# Altium footprint library ZLS_Lib.PcbLib: 157 footprints (part 1 of 10)
Each footprint in its own frame and in the unit in brackets; x right, y up, seen from the top. Pads: shape width x height; smd on the part's side, far side on the other; paste and mask are expansions set on the pad; w line width, h text height; cw(c..) or ccw(c..) is an arc to the next point about the centre after c.
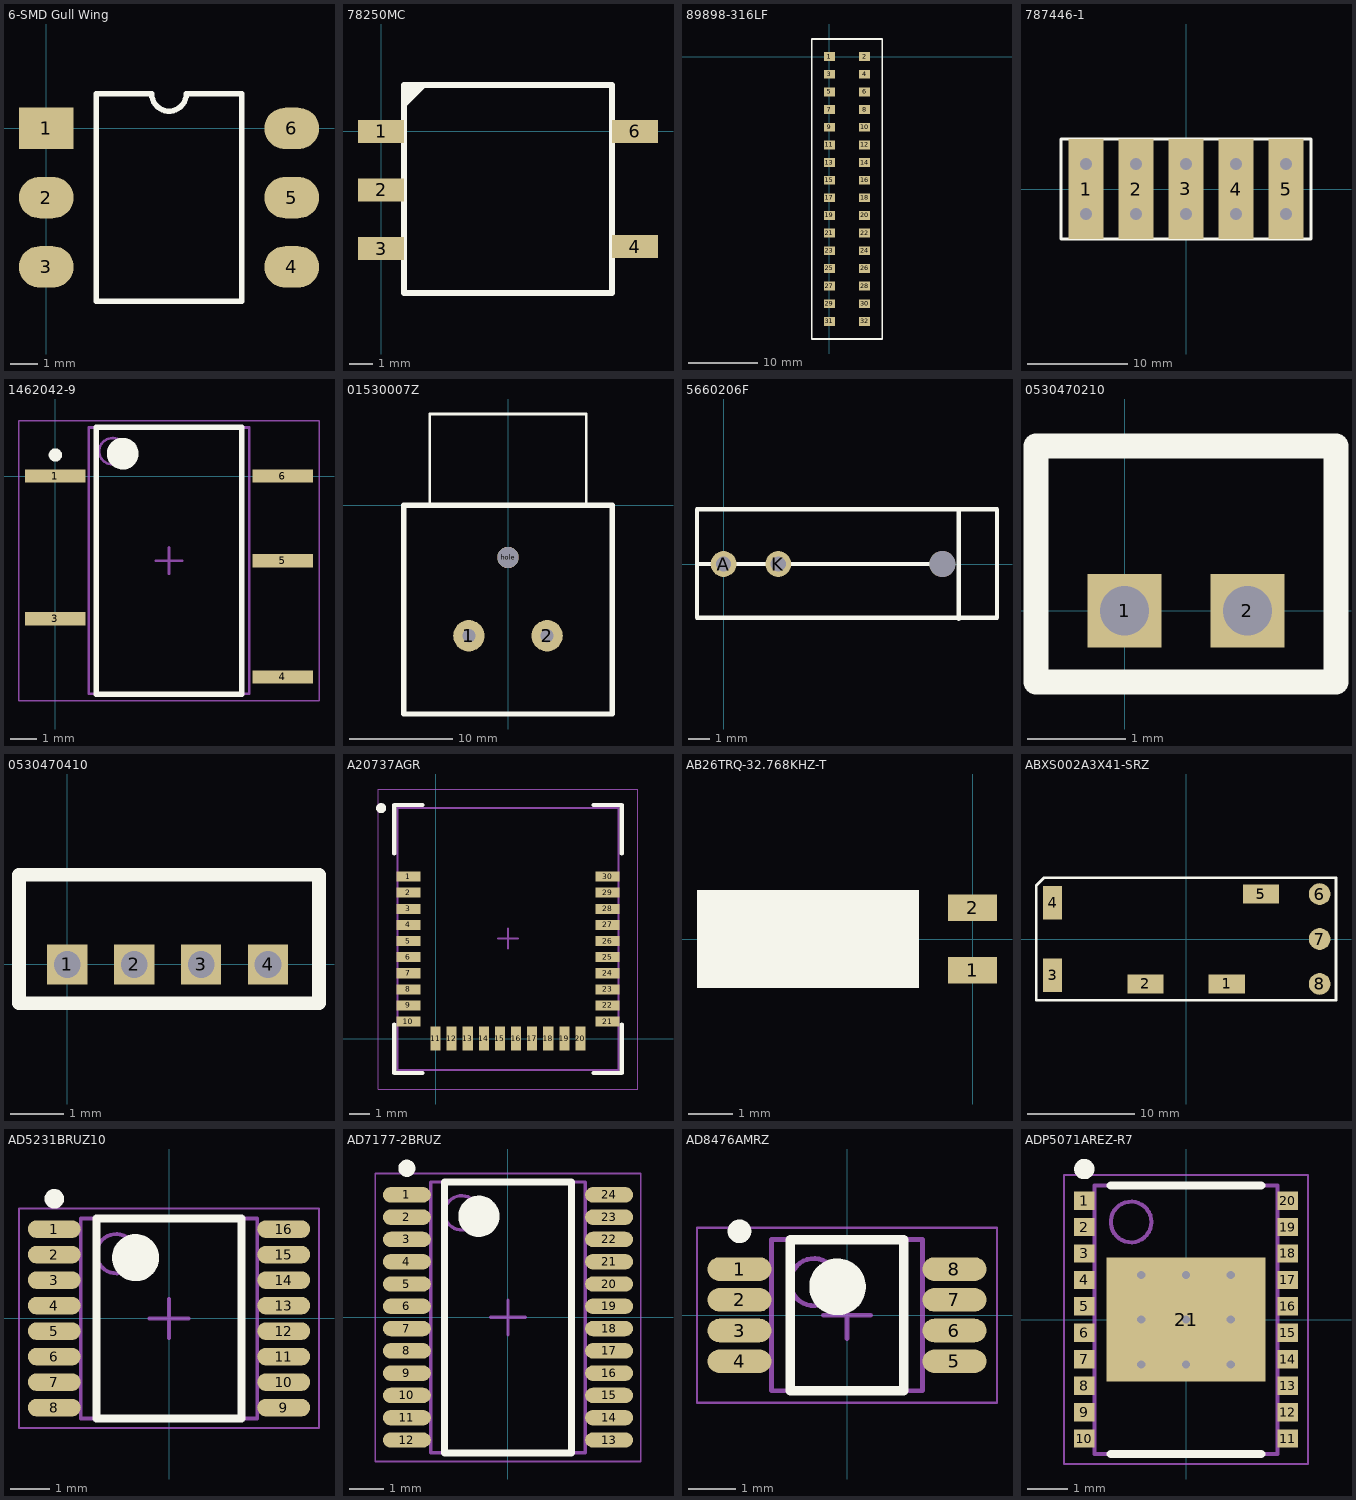
[diagram p0: the footprints below, top view; thin cyan lines are the x and y axes]

## 6-SMD Gull Wing [mm]
pads (6):
  rect 2x1.52 smd: 1(0,0)
  oval 2x1.52 smd: 2(0,-2.54) 3(0,-5.08) 4(9.01,-5.08) 5(9.01,-2.54) 6(9.01,0)
Top Overlay:
  lines w0.2: 1.835,-6.35 1.835,1.27 3.87,1.27 ccw(c4.505,1.27) 5.14,1.27 7.175,1.27 7.175,-6.35 1.835,-6.35
3D body: height 5, standoff 0, extent 1.735,-6.45 7.275,1.37

## 78250MC [mm]
pads (5):
  rect 2x1 smd: 1(0,0) 2(0,-2.54) 3(0,-5.08) 4(11,-5) 6(11,0)
Top Overlay:
  region: 1,2 2,2 1,1
  lines w0.254: 1,-7 1,2 10,2 10,-7 1,-7
3D body: height 1, standoff 0, extent -1,-5.5 1,-4.5
3D body: height 1, standoff 0, extent -1,-3 1,-2
3D body: height 1, standoff 0, extent -1,-0.5 1,0.5
3D body: height 1, standoff 0, extent 10,-0.5 12,0.5
3D body: height 7, standoff 0, extent 1,-7 10,2
3D body: height 1, standoff 0, extent 10,-5.5 12,-4.5

## 89898-316LF [mm] "n CONN RCPT 32POS .100 DL STR SMD"
height 7
pads (32):
  rect 1.57x1.27 smd: 1(0,0) 2(5.08,0) 3(0,-2.54) 4(5.08,-2.54) 5(0,-5.08) 6(5.08,-5.08) 7(0,-7.62) 8(5.08,-7.62) 9(0,-10.16) 10(5.08,-10.16) 11(0,-12.7) 12(5.08,-12.7) 13(0,-15.24) 14(5.08,-15.24) 15(0,-17.78) 16(5.08,-17.78) 17(0,-20.32) 18(5.08,-20.32) 19(0,-22.86) 20(5.08,-22.86) 21(0,-25.4) 22(5.08,-25.4) 23(0,-27.94) 24(5.08,-27.94) 25(0,-30.48) 26(5.08,-30.48) 27(0,-33.02) 28(5.08,-33.02) 29(0,-35.56) 30(5.08,-35.56) 31(0,-38.1) 32(5.08,-38.1)
Top Overlay:
  lines w0.254: -2.54,-40.64 -2.54,0 -2.54,2.54 7.62,2.54 7.62,-40.64 -2.54,-40.64
3D body: height 7, standoff 1, extent -2.54,-40.64 7.62,2.54

## 787446-1 [mm] "CONN HDR 5POS 5.00MM KINKED PIN"
height 8.95
pads (5):
  rect 3.5x10 smd: 1(-10,0) 2(-5,0) 3(0,0) 4(5,0) 5(10,0)
via -10,-2.5 diameter 2 hole 1.168
via -10,2.5 diameter 2 hole 1.168
via -5,2.5 diameter 2 hole 1.168
via 0,2.5 diameter 2 hole 1.168
via 5,2.5 diameter 2 hole 1.168
via 10,2.5 diameter 2 hole 1.168
via -5,-2.5 diameter 2 hole 1.168
via 0,-2.5 diameter 2 hole 1.168
via 5,-2.5 diameter 2 hole 1.168
via 10,-2.5 diameter 2 hole 1.168
Top Overlay:
  lines w0.254: -12.5,-5 -12.5,5 12.5,5 12.5,-5 -12.5,-5
3D body "c-5787446-1-a-3d.stp": height 8.95, standoff -3.05, extent -13.51,-4.9 13.51,4.9

## 1462042-9 [mm] "RLY, 6-Leads, Body 10.08x6.08mm (max), Pitch 3.20mm, IPC Medium Density"
height 5.67
pads (5):
  rect 2.3x0.5 smd: 1(0,0) 3(0,-5.4) 4(8.6,-7.6) 5(8.6,-3.2) 6(8.6,0)
Top Overlay:
  circle w0.25: c0,0.8 r0.125
  circle w0.6: c2.55,0.85 r0.3
  lines w0.2: 1.55,-8.25 7.05,-8.25 7.05,1.85 1.55,1.85 1.55,-8.25
Mechanical 13:
  circle w0.1: c2.16,0.94 r0.5
  lines w0.1: 1.26,-8.24 7.34,-8.24 7.34,1.84 1.26,1.84 1.26,-8.24
Mechanical 15:
  lines w0.05: -1.375,-8.5 9.975,-8.5 9.975,2.1 -1.375,2.1 -1.375,-8.5
  lines w0.1: 3.8,-3.2 4.8,-3.2 ; 4.3,-3.7 4.3,-2.7
3D body: height 4.67, standoff 0, extent -0.735,-8.24 9.335,1.84

## 01530007Z [mil] "Fuse Holder"
height 300
pads (3):
  round 120 hole 50: 1(-150,-500) 2(150,-500)
  round 82 hole 82: hole(0,-200)
Top Overlay:
  lines w10: -300,0 -300,350 300,350 300,0
  lines w20: -400,-800 400,-800 400,0 -400,0 -400,-800
3D body: height 300, standoff 0, extent -399.98,-799.98 399.98,-0.02
3D body: height 300, standoff 0, extent -410,-810 410,-2
3D body: height 300, standoff 0, extent -299.98,0.02 299.98,349.98
3D body: height 300, standoff 0, extent -410,-810 410,0
3D body: height 300, standoff 0, extent -214,-564 214,-155
3D body: height 300, standoff 0, extent -214,-564 214,-155
3D body: height 300, standoff 0, extent -410,-810 410,0
3D body: height 300, standoff 0, extent -299.98,0.02 299.98,349.98
3D body: height 300, standoff 0, extent -410,-810 410,0
3D body: height 300, standoff 0, extent -399.98,-799.98 399.98,-0.02
3D body: height 300, standoff 0, extent -410,-810 410,0
3D body: height 300, standoff 0, extent -214,-564 214,-155
3D body: height 300, standoff 0, extent -214,-564 214,0
3D body: height 300, standoff 0, extent -410,-810 410,0
3D body: height 300, standoff 0, extent -399.98,-799.98 399.98,-0.02
3D body: height 300, standoff 0, extent -299.98,0.02 299.98,349.98

## 5660206F [mm]
pads (3):
  round 1.2 hole 0.7: A(0,0) K(2.54,0)
  round 1.21 hole 1.21: Alignment(10.16,0)
Top Overlay:
  lines w0.2: -1.235,0 1.34,0 ; 1.2,0 10.16,0 ; 8.491,2.54 8.781,2.54 12.7,2.54 12.7,-2.5 -1.235,-2.5 -1.235,2.54 3.815,2.54 7.192,2.54 10.922,2.54 10.922,-2.54
3D body: height 0, standoff 0, extent -1.335,-2.64 12.8,2.64
3D body: height 0, standoff 0, extent 10.923,-2.499 12.699,2.539
3D body: height 0, standoff 0, extent -1.234,-2.499 10.921,2.539
3D body: height 0, standoff 0, extent -1.335,-2.64 12.8,2.64
3D body: height 0, standoff 0, extent -0.702,-0.707 10.867,0.707
3D body: height 0, standoff 0, extent -1.335,-2.64 12.8,2.64
3D body: height 0, standoff 0, extent 10.923,-2.499 12.699,2.539
3D body: height 0, standoff 0, extent -1.234,-2.499 10.921,2.539
3D body: height 0, standoff 0, extent -1.335,-2.64 12.8,2.64
3D body: height 0, standoff 0, extent -0.702,-0.707 10.867,0.707
3D body: height 0, standoff 0, extent -0.702,-0.707 10.867,0.707
3D body: height 0, standoff 0, extent -1.335,-2.64 12.8,2.64
3D body: height 0, standoff 0, extent -1.234,-2.499 10.921,2.539
3D body: height 0, standoff 0, extent -1.335,-2.64 12.8,2.64
3D body: height 0, standoff 0, extent 10.923,-2.499 12.699,2.539
3D body: height 0, standoff 0, extent -1.234,-2.499 10.921,2.539
3D body: height 0, standoff 0, extent -1.335,-2.64 12.8,2.64
3D body: height 0, standoff 0, extent -0.702,-0.707 10.867,0.707

## 0530470210 [mm] "CONN HEADER VERT 2POS 1.25MM"
height 4.2
pads (2):
  rect 0.75x0.75 hole 0.5: 1(0,0) 2(1.25,0)
Top Overlay:
  lines w0.254: -0.9,-0.725 -0.9,1.675 2.15,1.675 2.15,-0.725 -0.9,-0.725

## 0530470410 [mm] "CONN HEADER VERT 4POS 1.25MM"
height 4.2
pads (4):
  rect 0.75x0.75 hole 0.5: 1(0,0) 2(1.25,0) 3(2.5,0) 4(3.75,0)
Top Overlay:
  lines w0.254: -0.9,-0.725 -0.9,1.675 4.7,1.675 4.7,-0.725 -0.9,-0.725

## A20737AGR [mm] "Bluetooth LE Module"
height 2.1
pads (30):
  rect 1.2x0.5 smd: 1(-1.35,8.05) 2(-1.35,7.25) 3(-1.35,6.45) 4(-1.35,5.65) 5(-1.35,4.85) 6(-1.35,4.05) 7(-1.35,3.25) 8(-1.35,2.45) 9(-1.35,1.65) 10(-1.35,0.85) 21(8.55,0.85) 22(8.55,1.65) 23(8.55,2.45) 24(8.55,3.25) 25(8.55,4.05) 26(8.55,4.85) 27(8.55,5.65) 28(8.55,6.45) 29(8.55,7.25) 30(8.55,8.05)
  rect 0.5x1.2 smd: 11(0,0) 12(0.8,0) 13(1.6,0) 14(2.4,0) 15(3.2,0) 16(4,0) 17(4.8,0) 18(5.6,0) 19(6.4,0) 20(7.2,0)
Top Overlay:
  circle w0.25: c-2.7,11.45 r0.125
  lines w0.2: -2.05,0.7 -2.05,-1.7 -0.65,-1.7 ; -2.05,9.2 -2.05,11.6 -0.65,11.6 ; 7.85,-1.7 9.25,-1.7 9.25,0.7 ; 7.85,11.6 9.25,11.6 9.25,9.2
Mechanical 13:
  lines w0.1: -1.9,-1.55 9.1,-1.55 9.1,11.45 -1.9,11.45 -1.9,-1.55
Mechanical 15:
  lines w0.05: -2.85,-2.5 10.05,-2.5 10.05,12.4 -2.85,12.4 -2.85,-2.5
  lines w0.1: 3.1,4.975 4.1,4.975 ; 3.6,4.475 3.6,5.475
3D body: height 2.1, standoff 0.01, extent -2,-1.5 9,11.5

## AB26TRQ-32.768KHZ-T [mm] "Crystal"
height 1.4
pads (2):
  rect 1.1x0.6 smd: 1(0,-0.7) 2(0,0.7)
Top Overlay:
  rectangle: -6.2,-1.1 -1.2,1.1

## ABXS002A3X41-SRZ [mm] "DC/DC CONVERTER 16-34V 65W"
height 7.5
pads (8):
  rect 3.385x1.78 smd: 1(3.795,-4.19) 2(-3.795,-4.19) 5(6.975,4.19)
  rect 1.78x3.1 smd: 3(-12.445,-3.385) 4(-12.445,3.385)
  round 2.03 smd: 6(12.445,4.19) 7(12.445,0) 8(12.445,-4.19)
Top Overlay:
  lines w0.254: -13.97,-5.715 13.97,-5.715 13.97,5.715 -13.225,5.715 -13.97,4.97 -13.97,-5.715
3D body: height 7.5, standoff 0, extent -13.437,-5.307 13.562,5.307
3D body: height 7.5, standoff 0, extent -14.097,-5.842 14.097,5.842
3D body: height 7.5, standoff 0, extent -13.971,-5.716 13.971,5.716
3D body: height 7.5, standoff 0, extent -14.097,-5.842 14.097,5.842
3D body: height 7.5, standoff 0, extent -13.437,-5.307 13.562,5.307
3D body: height 7.5, standoff 0, extent -14.097,-5.842 14.097,5.842
3D body: height 7.5, standoff 0, extent -13.971,-5.716 13.971,5.716
3D body: height 7.5, standoff 0, extent -14.097,-5.842 14.097,5.842

## AD5231BRUZ10 [mm]
height 1.2
pads (16):
  oval 1.35x0.45 smd: 1(-2.925,2.275) 2(-2.925,1.625) 3(-2.925,0.975) 4(-2.925,0.325) 5(-2.925,-0.325) 6(-2.925,-0.975) 7(-2.925,-1.625) 8(-2.925,-2.275) 9(2.925,-2.275) 10(2.925,-1.625) 11(2.925,-0.975) 12(2.925,-0.325) 13(2.925,0.325) 14(2.925,0.975) 15(2.925,1.625) 16(2.925,2.275)
Top Overlay:
  circle w0.6: c-0.85,1.55 r0.3
  circle w0.25: c-2.925,3.05 r0.125
  lines w0.2: -1.85,-2.55 1.85,-2.55 1.85,2.55 -1.85,2.55 -1.85,-2.55
Mechanical 13:
  circle w0.1: c-1.35,1.65 r0.5
  lines w0.1: -2.25,-2.55 2.25,-2.55 2.25,2.55 -2.25,2.55 -2.25,-2.55
Mechanical 15:
  lines w0.05: -3.825,-2.8 3.825,-2.8 3.825,2.8 -3.825,2.8 -3.825,-2.8
  lines w0.1: -0.5,0 0.5,0 ; 0,-0.5 0,0.5
3D body "AD5231BRUZ10.step": height 1.2, standoff 0, extent -3.15,-2.55 3.15,2.55

## AD7177-2BRUZ [mm]
height 1.2
pads (24):
  oval 1.4x0.45 smd: 1(-2.95,3.575) 2(-2.95,2.925) 3(-2.95,2.275) 4(-2.95,1.625) 5(-2.95,0.975) 6(-2.95,0.325) 7(-2.95,-0.325) 8(-2.95,-0.975) 9(-2.95,-1.625) 10(-2.95,-2.275) 11(-2.95,-2.925) 12(-2.95,-3.575) 13(2.95,-3.575) 14(2.95,-2.925) 15(2.95,-2.275) 16(2.95,-1.625) 17(2.95,-0.975) 18(2.95,-0.325) 19(2.95,0.325) 20(2.95,0.975) 21(2.95,1.625) 22(2.95,2.275) 23(2.95,2.925) 24(2.95,3.575)
Top Overlay:
  circle w0.6: c-0.85,2.95 r0.3
  circle w0.25: c-2.95,4.35 r0.125
  lines w0.2: -1.85,-3.95 1.85,-3.95 1.85,3.95 -1.85,3.95 -1.85,-3.95
Mechanical 13:
  circle w0.1: c-1.35,3.05 r0.5
  lines w0.1: -2.25,-3.95 2.25,-3.95 2.25,3.95 -2.25,3.95 -2.25,-3.95
Mechanical 15:
  lines w0.05: -3.875,-4.2 3.875,-4.2 3.875,4.2 -3.875,4.2 -3.875,-4.2
  lines w0.1: -0.5,0 0.5,0 ; 0,-0.5 0,0.5
3D body "AD7177-2BRUZ.step": height 1.2, standoff 0, extent -3.2,-3.95 3.2,3.95

## AD8476AMRZ [mm]
height 1.1
pads (8):
  oval 1.35x0.5 smd: 1(-2.275,0.975) 2(-2.275,0.325) 3(-2.275,-0.325) 4(-2.275,-0.975) 5(2.275,-0.975) 6(2.275,-0.325) 7(2.275,0.325) 8(2.275,0.975)
Top Overlay:
  circle w0.6: c-0.2,0.6 r0.3
  circle w0.25: c-2.275,1.775 r0.125
  lines w0.2: -1.2,-1.6 1.2,-1.6 1.2,1.6 -1.2,1.6 -1.2,-1.6
Mechanical 13:
  circle w0.1: c-0.7,0.7 r0.5
  lines w0.1: -1.6,-1.6 1.6,-1.6 1.6,1.6 -1.6,1.6 -1.6,-1.6
Mechanical 15:
  lines w0.05: -3.175,-1.85 3.175,-1.85 3.175,1.85 -3.175,1.85 -3.175,-1.85
  lines w0.1: -0.5,0 0.5,0 ; 0,-0.5 0,0.5
3D body "AD8476AMRZ.step": height 1.1, standoff 0, extent -2.45,-1.6 2.45,1.6

## ADP5071AREZ-R7 [mm]
height 1.2
pads (21):
  rect 0.5x0.45 smd: 1(-2.5,2.925) 2(-2.5,2.275) 3(-2.5,1.625) 4(-2.5,0.975) 5(-2.5,0.325) 6(-2.5,-0.325) 7(-2.5,-0.975) 8(-2.5,-1.625) 9(-2.5,-2.275) 10(-2.5,-2.925) 11(2.5,-2.925) 12(2.5,-2.275) 13(2.5,-1.625) 14(2.5,-0.975) 15(2.5,-0.325) 16(2.5,0.325) 17(2.5,0.975) 18(2.5,1.625) 19(2.5,2.275) 20(2.5,2.925)
  rect 3.9x3.05 smd: 21(0,0)
via 1.1,-1.1 diameter 0.5 hole 0.2
via 0,-1.1 diameter 0.5 hole 0.2
via -1.1,-1.1 diameter 0.5 hole 0.2
via 1.1,0 diameter 0.5 hole 0.2
via 0,0 diameter 0.5 hole 0.2
via -1.1,0 diameter 0.5 hole 0.2
via 1.1,1.1 diameter 0.5 hole 0.2
via 0,1.1 diameter 0.5 hole 0.2
via -1.1,1.1 diameter 0.5 hole 0.2
Top Overlay:
  circle w0.25: c-2.5,3.7 r0.125
  lines w0.2: -1.85,-3.3 1.85,-3.3 ; -1.85,3.3 1.85,3.3
Mechanical 13:
  circle w0.1: c-1.35,2.4 r0.5
  lines w0.1: -2.25,-3.3 2.25,-3.3 2.25,3.3 -2.25,3.3 -2.25,-3.3
Mechanical 15:
  lines w0.05: -3,-3.55 3,-3.55 3,3.55 -3,3.55 -3,-3.55
  lines w0.1: -0.5,0 0.5,0 ; 0,-0.5 0,0.5
3D body "ADP5071AREZ-R7.step": height 1.25, standoff 0.05, extent -2.395,-3.3 2.395,3.3